# Altium footprint library Connectors THD.PcbLib: 631 footprints (part 35 of 46) (continued)
## SAMTEC_TSW-104-23-L-S [mm] "4 Contacts - Pitch 2.54mm - Single Row  Through Mount Straigh Header (Post Lead 5.84mm, Tail Lead 2.92mm, Insulator 2.54mm)"
height 8.38
pads (4):
  round 1.7 hole 1: 1(0,0) 2(2.54,0) 3(5.08,0) 4(7.62,0)
Top Overlay:
  circle w0.3: c-0.508,1.778 r0.15
  lines w0.2: 6.087,-0.762 6.087,-1.27 4.073,-1.27 4.073,-0.762 3.547,-0.762 3.547,-1.27 1.533,-1.27 1.533,-0.762 1.007,-0.762 1.007,-1.27 -1.27,-1.27 -1.27,1.27 1.007,1.27 1.007,0.762 1.533,0.762 1.533,1.27 3.547,1.27 3.547,0.762 4.073,0.762 4.073,1.27 6.087,1.27 6.087,0.762 ; 6.087,-0.762 6.613,-0.762 ; 6.087,-0.762 6.613,-0.762 ; 6.087,0.762 6.613,0.762 ; 6.087,0.762 6.613,0.762 ; 6.613,-0.762 6.613,-1.27 8.89,-1.27 8.89,1.27 6.613,1.27 6.613,0.762
Mechanical 8:
  lines w0.1: -0.5,0 0,0 ; 0,-0.5 0,0 ; 0,0.5 0,0 ; 0.5,0 0,0 ; 2.04,0 2.54,0 ; 2.54,-0.5 2.54,0 ; 2.54,0.5 2.54,0 ; 3.04,0 2.54,0 ; 4.58,0 5.08,0 ; 5.08,-0.5 5.08,0 ; 5.08,0.5 5.08,0 ; 5.58,0 5.08,0 ; 7.12,0 7.62,0 ; 7.62,-0.5 7.62,0 ; 7.62,0.5 7.62,0 ; 8.12,0 7.62,0
Mechanical 14:
  circle w0.3: c-0.508,1.778 r0.15
  lines w0.1: 1.007,-0.762 1.533,-0.762 ; 1.007,0.762 1.533,0.762 ; 3.547,-0.762 4.073,-0.762 ; 3.547,0.762 4.073,0.762 ; -1.27,-1.27 -1.27,1.27 1.007,1.27 1.007,-1.27 -1.27,-1.27 ; -0.317,-0.318 -0.318,0.317 0.317,0.317 0.318,-0.317 -0.317,-0.318 ; 1.533,-1.27 3.547,-1.27 3.547,1.27 1.533,1.27 1.533,-1.27 ; 2.223,-0.318 2.222,0.317 2.857,0.317 2.858,-0.317 2.223,-0.318 ; 4.073,-1.27 4.073,1.27 6.087,1.27 6.087,-1.27 4.073,-1.27 ; 4.763,-0.318 4.763,0.317 5.397,0.317 5.398,-0.317 4.763,-0.318 ; 6.087,-0.762 6.613,-0.762 6.087,-0.762 ; 6.087,0.762 6.613,0.762 6.087,0.762 ; 6.613,-1.27 6.613,1.27 8.89,1.27 8.89,-1.27 6.613,-1.27 ; 7.303,-0.318 7.303,0.317 7.938,0.317 7.938,-0.318 7.303,-0.318
3D body: height 8.38, standoff -2.92, extent -1.27,-1.27 8.89,1.27

## SAMTEC_TSW-105-07-L-D-LL [mm] "10 Contacts, Pitch 2.54mm - Dual Row, Through Mount Straigh Header"
height 11.05
pads (10):
  round 1.7 hole 1: 1(-5.08,-1.27) 2(-5.08,1.27) 3(-2.54,-1.27) 4(-2.54,1.27) 5(0,-1.27) 6(0,1.27) 7(2.54,-1.27) 8(2.54,1.27) 9(5.08,-1.27) 10(5.08,1.27)
Top Overlay:
  circle w0.3: c-5.045,-3.135 r0.15
  lines w0.2: -6.35,-2.54 -6.35,2.54 ; -6.35,-2.54 -6.35,2.54 ; -6.35,-2.54 -4.064,-2.54 -4.064,-2.032 -3.556,-2.032 -3.556,-2.54 -1.524,-2.54 -1.524,-2.032 -1.016,-2.032 -1.016,-2.54 1.016,-2.54 1.016,-2.032 1.524,-2.032 1.524,-2.54 3.556,-2.54 3.556,-2.032 4.064,-2.032 4.064,-2.54 6.35,-2.54 ; -6.35,2.54 -4.064,2.54 -4.064,2.032 -3.556,2.032 -3.556,2.54 -1.524,2.54 -1.524,2.032 -1.016,2.032 -1.016,2.54 1.016,2.54 1.016,2.032 1.524,2.032 1.524,2.54 3.556,2.54 3.556,2.032 4.064,2.032 4.064,2.54 6.35,2.54 ; 6.35,-2.54 6.35,2.54 ; 6.35,-2.54 6.35,2.54
  text "1" at -7.327,-1.768 h1
Mechanical 8:
  lines w0.1: -5.58,-1.27 -5.08,-1.27 ; -5.58,1.27 -5.08,1.27 ; -5.08,-1.77 -5.08,-1.27 ; -5.08,-0.77 -5.08,-1.27 ; -5.08,0.77 -5.08,1.27 ; -5.08,1.77 -5.08,1.27 ; -4.58,-1.27 -5.08,-1.27 ; -4.58,1.27 -5.08,1.27 ; -3.04,-1.27 -2.54,-1.27 ; -3.04,1.27 -2.54,1.27 ; -2.54,-1.77 -2.54,-1.27 ; -2.54,-0.77 -2.54,-1.27 ; -2.54,0.77 -2.54,1.27 ; -2.54,1.77 -2.54,1.27 ; -2.04,-1.27 -2.54,-1.27 ; -2.04,1.27 -2.54,1.27 ; -0.5,-1.27 0,-1.27 ; -0.5,0 0,0 ; -0.5,1.27 0,1.27 ; 0,-1.77 0,-1.27 ; 0,-0.77 0,-1.27 ; 0,-0.5 0,0 ; 0,0.5 0,0 ; 0,0.77 0,1.27 ; 0,1.77 0,1.27 ; 0.5,-1.27 0,-1.27 ; 0.5,0 0,0 ; 0.5,1.27 0,1.27 ; 2.04,-1.27 2.54,-1.27 ; 2.04,1.27 2.54,1.27 ; 2.54,-1.77 2.54,-1.27 ; 2.54,-0.77 2.54,-1.27 ; 2.54,0.77 2.54,1.27 ; 2.54,1.77 2.54,1.27 ; 3.04,-1.27 2.54,-1.27 ; 3.04,1.27 2.54,1.27 ; 4.58,-1.27 5.08,-1.27 ; 4.58,1.27 5.08,1.27 ; 5.08,-1.77 5.08,-1.27 ; 5.08,-0.77 5.08,-1.27 ; 5.08,0.77 5.08,1.27 ; 5.08,1.77 5.08,1.27 ; 5.58,-1.27 5.08,-1.27 ; 5.58,1.27 5.08,1.27
Mechanical 14:
  drawing of 158 lines, arcs and shapes, not listed
  text "1" at -7.327,-1.768 h1
3D body: height 8.38, standoff -2.54, extent -6.35,-2.54 6.35,2.54

## SAMTEC_TSW-132-23-L-T [mm] "96 Contacts - Pitch 2.54mm - Triple Row Through Mount Straigh Header (Lead Length 2.92mm)"
height 11.3
pads (96):
  round 1.7 hole 1: 1(-39.37,-2.54) 2(-39.37,0) 3(-39.37,2.54) 4(-36.83,-2.54) 5(-36.83,0) 6(-36.83,2.54) 7(-34.29,-2.54) 8(-34.29,0) 9(-34.29,2.54) 10(-31.75,-2.54) 11(-31.75,0) 12(-31.75,2.54) 13(-29.21,-2.54) 14(-29.21,0) 15(-29.21,2.54) 16(-26.67,-2.54) 17(-26.67,0) 18(-26.67,2.54) 19(-24.13,-2.54) 20(-24.13,0) 21(-24.13,2.54) 22(-21.59,-2.54) 23(-21.59,0) 24(-21.59,2.54) 25(-19.05,-2.54) 26(-19.05,0) 27(-19.05,2.54) 28(-16.51,-2.54) 29(-16.51,0) 30(-16.51,2.54) 31(-13.97,-2.54) 32(-13.97,0) 33(-13.97,2.54) 34(-11.43,-2.54) 35(-11.43,0) 36(-11.43,2.54) 37(-8.89,-2.54) 38(-8.89,0) 39(-8.89,2.54) 40(-6.35,-2.54) 41(-6.35,0) 42(-6.35,2.54) 43(-3.81,-2.54) 44(-3.81,0) 45(-3.81,2.54) 46(-1.27,-2.54) 47(-1.27,0) 48(-1.27,2.54) 49(1.27,-2.54) 50(1.27,0) 51(1.27,2.54) 52(3.81,-2.54) 53(3.81,0) 54(3.81,2.54) 55(6.35,-2.54) 56(6.35,0) 57(6.35,2.54) 58(8.89,-2.54) 59(8.89,0) 60(8.89,2.54) 61(11.43,-2.54) 62(11.43,0) 63(11.43,2.54) 64(13.97,-2.54) 65(13.97,0) 66(13.97,2.54) 67(16.51,-2.54) 68(16.51,0) 69(16.51,2.54) 70(19.05,-2.54) 71(19.05,0) 72(19.05,2.54) 73(21.59,-2.54) 74(21.59,0) 75(21.59,2.54) 76(24.13,-2.54) 77(24.13,0) 78(24.13,2.54) 79(26.67,-2.54) 80(26.67,0) 81(26.67,2.54) 82(29.21,-2.54) 83(29.21,0) 84(29.21,2.54) 85(31.75,-2.54) 86(31.75,0) 87(31.75,2.54) 88(34.29,-2.54) 89(34.29,0) 90(34.29,2.54) 91(36.83,-2.54) 92(36.83,0) 93(36.83,2.54) 94(39.37,-2.54) 95(39.37,0) 96(39.37,2.54)
Top Overlay:
  drawing of 253 lines, arcs and shapes, not listed
  text "3" at -41.917,2.042 h1
  text "94" at 41.34,-3.12 h1
  text "2" at -41.917,-0.498 h1
  text "1" at -41.617,-3.038 h1
  text "95" at 41.34,-0.58 h1
  text "96" at 41.34,1.96 h1
Mechanical 8:
  lines w0.1: -39.87,-2.54 -39.37,-2.54 ; -39.87,0 -39.37,0 ; -39.87,2.54 -39.37,2.54 ; -39.37,-3.04 -39.37,-2.54 ; -39.37,-2.04 -39.37,-2.54 ; -39.37,-0.5 -39.37,0 ; -39.37,0.5 -39.37,0 ; -39.37,2.04 -39.37,2.54 ; -39.37,3.04 -39.37,2.54 ; -38.87,-2.54 -39.37,-2.54 ; -38.87,0 -39.37,0 ; -38.87,2.54 -39.37,2.54 ; -0.5,0 0,0 ; 0,-0.5 0,0 ; 0,0.5 0,0 ; 0.5,0 0,0 ; 38.87,-2.54 39.37,-2.54 ; 38.87,0 39.37,0 ; 38.87,2.54 39.37,2.54 ; 39.37,-3.04 39.37,-2.54 ; 39.37,-2.04 39.37,-2.54 ; 39.37,-0.5 39.37,0 ; 39.37,0.5 39.37,0 ; 39.37,2.04 39.37,2.54 ; 39.37,3.04 39.37,2.54 ; 39.87,-2.54 39.37,-2.54 ; 39.87,0 39.37,0 ; 39.87,2.54 39.37,2.54
Mechanical 14:
  drawing of 699 lines, arcs and shapes, not listed
  text "3" at -41.917,2.042 h1
  text "94" at 41.34,-3.12 h1
  text "2" at -41.917,-0.498 h1
  text "1" at -41.617,-3.038 h1
  text "95" at 41.34,-0.58 h1
  text "96" at 41.34,1.96 h1
3D body: height 8.38, standoff -2.92, extent -40.64,-3.81 40.64,3.81

## SAMTEC_TSW-150-25-L-D-RA [mm] "100 Contacts - Pitch 2.54mm - Double Row Through Mount Right Angle Header"
height 5.56
pads (100):
  round 1.7 hole 1: 1(62.23,1.27) 2(62.23,-1.27) 3(59.69,1.27) 4(59.69,-1.27) 5(57.15,1.27) 6(57.15,-1.27) 7(54.61,1.27) 8(54.61,-1.27) 9(52.07,1.27) 10(52.07,-1.27) 11(49.53,1.27) 12(49.53,-1.27) 13(46.99,1.27) 14(46.99,-1.27) 15(44.45,1.27) 16(44.45,-1.27) 17(41.91,1.27) 18(41.91,-1.27) 19(39.37,1.27) 20(39.37,-1.27) 21(36.83,1.27) 22(36.83,-1.27) 23(34.29,1.27) 24(34.29,-1.27) 25(31.75,1.27) 26(31.75,-1.27) 27(29.21,1.27) 28(29.21,-1.27) 29(26.67,1.27) 30(26.67,-1.27) 31(24.13,1.27) 32(24.13,-1.27) 33(21.59,1.27) 34(21.59,-1.27) 35(19.05,1.27) 36(19.05,-1.27) 37(16.51,1.27) 38(16.51,-1.27) 39(13.97,1.27) 40(13.97,-1.27) 41(11.43,1.27) 42(11.43,-1.27) 43(8.89,1.27) 44(8.89,-1.27) 45(6.35,1.27) 46(6.35,-1.27) 47(3.81,1.27) 48(3.81,-1.27) 49(1.27,1.27) 50(1.27,-1.27) 51(-1.27,1.27) 52(-1.27,-1.27) 53(-3.81,1.27) 54(-3.81,-1.27) 55(-6.35,1.27) 56(-6.35,-1.27) 57(-8.89,1.27) 58(-8.89,-1.27) 59(-11.43,1.27) 60(-11.43,-1.27) 61(-13.97,1.27) 62(-13.97,-1.27) 63(-16.51,1.27) 64(-16.51,-1.27) 65(-19.05,1.27) 66(-19.05,-1.27) 67(-21.59,1.27) 68(-21.59,-1.27) 69(-24.13,1.27) 70(-24.13,-1.27) 71(-26.67,1.27) 72(-26.67,-1.27) 73(-29.21,1.27) 74(-29.21,-1.27) 75(-31.75,1.27) 76(-31.75,-1.27) 77(-34.29,1.27) 78(-34.29,-1.27) 79(-36.83,1.27) 80(-36.83,-1.27) 81(-39.37,1.27) 82(-39.37,-1.27) 83(-41.91,1.27) 84(-41.91,-1.27) 85(-44.45,1.27) 86(-44.45,-1.27) 87(-46.99,1.27) 88(-46.99,-1.27) 89(-49.53,1.27) 90(-49.53,-1.27) 91(-52.07,1.27) 92(-52.07,-1.27) 93(-54.61,1.27) 94(-54.61,-1.27) 95(-57.15,1.27) 96(-57.15,-1.27) 97(-59.69,1.27) 98(-59.69,-1.27) 99(-62.23,1.27) 100(-62.23,-1.27)
Top Overlay:
  drawing of 255 lines, arcs and shapes, not listed
  text "99" at -65.125,0.89 h1
  text "100" at -65.9,-1.735 h1
  text "50" at 0.5,-3.59 h1
  text "1" at 63.78,1.89 h1.02
  text "2" at 63.748,-1.668 h1
Mechanical 8:
  drawing of 404 lines, arcs and shapes, not listed
Mechanical 14:
  drawing of 605 lines, arcs and shapes, not listed
  text "99" at -65.125,0.89 h1
  text "100" at -65.9,-1.735 h1
  text "50" at 0.5,-3.59 h1
  text "1" at 63.78,1.89 h1.02
  text "2" at 63.748,-1.668 h1
3D body: height 5.56, standoff -2.54, extent -63.5,-1.587 63.5,13.462

## SAMTEC_USB3-B-S-F-TH [mm] "Right Angle, Shielded USB 3.0 Standard B Receptacle"
height 12.9
pads (11):
  round 1.6 hole 0.9: 1(1.25,1) 2(-1.25,1) 3(-1.25,-1) 4(1.25,-1)
  round 1.4 hole 0.7: 5(-4.25,3) 6(-2.5,3) 7(0,3) 8(2.5,3) 9(4.25,3)
  round 3 hole 2.3: SH(-6.02,-3.71) SH(6.02,-3.71)
Top Overlay:
  lines w0.2: -6,-5.61 -6,-13.415 ; -6,-1.81 -6,4.235 6,4.235 6,-1.81 ; -6,3.935 -4.829,3.935 ; -5.7,-13.415 ccw(c-5.4,-13.415) -5.4,-13.715 -3.45,-13.715 ; -5.5,3.935 -5.5,4.235 ; -5.4,-13.415 -5.4,-5.506 ; -5.4,-1.914 -5.4,3.935 ; -5.2,-13.715 -5.2,-13.415 -6,-13.415 ; -2.9,-14.015 -5.4,-14.015 cw(c-5.4,-13.415) -6,-13.415 ; -2.9,-13.953 ccw(c-2.619,-13.932) -2.6,-14.213 ; -2.9,-13.79 2.9,-13.785 ; -2.9,-13.714 -3.45,-13.715 ; -2.9,-13.635 2.9,-13.635 ; 2.6,-14.213 ccw(c2.619,-13.932) 2.9,-13.953 ; 2.9,-14.015 5.4,-14.015 ccw(c5.4,-13.415) 6,-13.415 ; 2.9,-13.714 3.45,-13.715 ; 4.829,3.935 6,3.935 ; 5.19,-13.715 5.2,-13.415 6,-13.415 ; 5.4,-13.415 5.4,-5.506 ; 5.4,-1.914 5.4,3.935 ; 5.5,3.935 5.5,4.235 ; 5.7,-13.415 cw(c5.4,-13.415) 5.4,-13.715 3.45,-13.715 ; 6,-5.61 6,-13.415 ; -3.45,-13.715 ccw(c-3.45,-13.565) -3.3,-13.565 cw(c-3.15,-13.565) -3.15,-13.415 -3.05,-13.415 cw(c-3.05,-13.565) -2.9,-13.565 -2.9,-14.103 ccw(c-2.619,-14.082) -2.6,-14.363 ; -2.6,-14.363 2.6,-14.363 ; -2.6,-14.363 -2.6,-14.213 ; -2.6,-14.213 2.6,-14.214 2.6,-14.363 ; 2.6,-14.363 ccw(c2.619,-14.082) 2.9,-14.103 2.9,-13.953 ; 2.9,-13.953 2.9,-13.565 cw(c3.05,-13.565) 3.05,-13.415 3.15,-13.415 cw(c3.15,-13.565) 3.3,-13.565 ccw(c3.45,-13.565) 3.45,-13.715
Mechanical 8:
  lines w0.1: -6.52,-3.71 -6.02,-3.71 ; -6.02,-4.21 -6.02,-3.71 ; -6.02,-3.21 -6.02,-3.71 ; -5.52,-3.71 -6.02,-3.71 ; -4.75,3 -4.25,3 ; -4.25,2.5 -4.25,3 ; -4.25,3.5 -4.25,3 ; -3.75,3 -4.25,3 ; -3,3 -2.5,3 ; -2.5,2.5 -2.5,3 ; -2.5,3.5 -2.5,3 ; -2,3 -2.5,3 ; -1.75,-1 -1.25,-1 ; -1.75,1 -1.25,1 ; -1.25,-1.5 -1.25,-1 ; -1.25,-0.5 -1.25,-1 ; -1.25,0.5 -1.25,1 ; -1.25,1.5 -1.25,1 ; -0.75,-1 -1.25,-1 ; -0.75,1 -1.25,1 ; -0.5,0 0,0 ; -0.5,3 0,3 ; 0,-0.5 0,0 ; 0,0.5 0,0 ; 0,2.5 0,3 ; 0,3.5 0,3 ; 0.5,0 0,0 ; 0.5,3 0,3 ; 0.75,-1 1.25,-1 ; 0.75,1 1.25,1 ; 1.25,-1.5 1.25,-1 ; 1.25,-0.5 1.25,-1 ; 1.25,0.5 1.25,1 ; 1.25,1.5 1.25,1 ; 1.75,-1 1.25,-1 ; 1.75,1 1.25,1 ; 2,3 2.5,3 ; 2.5,2.5 2.5,3 ; 2.5,3.5 2.5,3 ; 3,3 2.5,3 ; 3.75,3 4.25,3 ; 4.25,2.5 4.25,3 ; 4.25,3.5 4.25,3 ; 4.75,3 4.25,3 ; 5.52,-3.71 6.02,-3.71 ; 6.02,-4.21 6.02,-3.71 ; 6.02,-3.21 6.02,-3.71 ; 6.52,-3.71 6.02,-3.71
Mechanical 14:
  lines w0.1: -6,-5.015 ccw(c-6.093,-5.018) -6.026,-4.953 -7.201,-4.348 -7.252,-4.326 -7.252,-3.104 -7.201,-3.082 ; -6,-2.415 cw(c-6.093,-2.412) -6.026,-2.477 ; -6,3.935 6,3.935 ; -5.7,-13.415 ccw(c-5.4,-13.415) -5.4,-13.715 -3.45,-13.715 ; -5.5,3.935 -5.5,4.235 ; -5.4,-13.415 -5.4,3.935 ; -5.2,-13.715 -5.2,-13.415 -6,-13.415 ; -3.8,3.935 -3.8,4.235 ; -3.5,3.935 -3.5,4.235 ; -2.9,-14.015 -5.4,-14.015 cw(c-5.4,-13.415) -6,-13.415 ; -2.9,-13.953 ccw(c-2.619,-13.932) -2.6,-14.213 ; -2.9,-13.79 2.9,-13.785 ; -2.9,-13.714 -3.45,-13.715 ; -2.9,-13.635 2.9,-13.635 ; 2.6,-14.213 ccw(c2.619,-13.932) 2.9,-13.953 ; 2.9,-14.015 5.4,-14.015 ccw(c5.4,-13.415) 6,-13.415 ; 2.9,-13.714 3.45,-13.715 ; 3.5,3.935 3.5,4.235 ; 3.8,3.935 3.8,4.235 ; 5.19,-13.715 5.2,-13.415 6,-13.415 ; 5.4,-13.415 5.4,3.935 ; 5.5,3.935 5.5,4.235 ; 5.7,-13.415 cw(c5.4,-13.415) 5.4,-13.715 3.45,-13.715 ; 6,-5.015 cw(c6.093,-5.018) 6.026,-4.953 7.201,-4.348 7.252,-4.326 7.252,-3.104 7.201,-3.082 ; 6,-2.415 ccw(c6.093,-2.412) 6.026,-2.477 ; -7.201,-3.082 -6.026,-2.477 ; -7.201,-3.082 -6.026,-2.477 ; -6,-13.415 -6,4.235 6,4.235 6,-13.415 ; -3.45,-13.715 ccw(c-3.45,-13.565) -3.3,-13.565 cw(c-3.15,-13.565) -3.15,-13.415 -3.05,-13.415 cw(c-3.05,-13.565) -2.9,-13.565 -2.9,-14.103 ccw(c-2.619,-14.082) -2.6,-14.363 ; -2.6,-14.363 2.6,-14.363 ; -2.6,-14.363 -2.6,-14.213 ; -2.6,-14.213 2.6,-14.214 2.6,-14.363 ; 2.6,-14.363 ccw(c2.619,-14.082) 2.9,-14.103 2.9,-13.953 ; 2.9,-13.953 2.9,-13.565 cw(c3.05,-13.565) 3.05,-13.415 3.15,-13.415 cw(c3.15,-13.565) 3.3,-13.565 ccw(c3.45,-13.565) 3.45,-13.715 ; 6.026,-2.477 7.201,-3.082 ; 6.026,-2.477 7.201,-3.082
3D body: height 13.19, standoff -3.04, extent -7.252,-14.363 7.252,4.235

## SAMTEC_VHDCR-68-01-M-RA [mm] "68 Positions, Pitch 0.8mm, Very Hight Density Right Angle Connector, VHDCR Series"
height 6
pads (72):
  round 1.05 hole 0.65: 1(-13,-2.35) 2(-12.2,-1.2) 3(-11.4,-2.35) 4(-10.6,-1.2) 5(-9.8,-2.35) 6(-9,-1.2) 7(-8.2,-2.35) 8(-7.4,-1.2) 9(-6.6,-2.35) 10(-5.8,-1.2) 11(-5,-2.35) 12(-4.2,-1.2) 13(-3.4,-2.35) 14(-2.6,-1.2) 15(-1.8,-2.35) 16(-1,-1.2) 17(-0.2,-2.35) 18(0.6,-1.2) 19(1.4,-2.35) 20(2.2,-1.2) 21(3,-2.35) 22(3.8,-1.2) 23(4.6,-2.35) 24(5.4,-1.2) 25(6.2,-2.35) 26(7,-1.2) 27(7.8,-2.35) 28(8.6,-1.2) 29(9.4,-2.35) 30(10.2,-1.2) 31(11,-2.35) 32(11.8,-1.2) 33(12.6,-2.35) 34(13.4,-1.2) 35(-13.4,0) 36(-12.6,1.15) 37(-11.8,0) 38(-11,1.15) 39(-10.2,0) 40(-9.4,1.15) 41(-8.6,0) 42(-7.8,1.15) 43(-7,0) 44(-6.2,1.15) 45(-5.4,0) 46(-4.6,1.15) 47(-3.8,0) 48(-3,1.15) 49(-2.2,0) 50(-1.4,1.15) 51(-0.6,0) 52(0.2,1.15) 53(1,0) 54(1.8,1.15) 55(2.6,0) 56(3.4,1.15) 57(4.2,0) 58(5,1.15) 59(5.8,0) 60(6.6,1.15) 61(7.4,0) 62(8.2,1.15) 63(9,0) 64(9.8,1.15) 65(10.6,0) 66(11.4,1.15) 67(12.2,0) 68(13,1.15)
  round 2.3 hole 1.2: 69(16.17,-0.105) 70(-16.17,-0.105)
  round 1 hole 1.8 unplated: 71(20.95,2.51) 72(-20.95,2.51)
Top Layer:
  region: 17.42,-2.557 17.425,-0.76 17.544,-0.473 17.592,-0.105 17.544,0.263 17.425,0.55 17.42,0.547 17.42,2.347 19.701,2.347 19.722,2.181 19.849,1.875 20.051,1.611 20.315,1.409 20.621,1.282 20.95,1.239 21.279,1.282 21.585,1.409 21.72,1.513 21.72,-2.557
  region: -17.42,-2.557 -17.425,-0.76 -17.544,-0.473 -17.592,-0.105 -17.544,0.263 -17.425,0.55 -17.42,0.547 -17.42,2.347 -19.701,2.347 -19.722,2.181 -19.849,1.875 -20.051,1.611 -20.315,1.409 -20.621,1.282 -20.95,1.239 -21.279,1.282 -21.585,1.409 -21.72,1.513 -21.72,-2.557
Top Overlay:
  lines w0.2: -21.35,6.144 21.35,6.094 ; -21.349,3.705 -21.348,6.144 cw(c-21.048,6.144) -21.048,6.444 21.05,6.444 cw(c21.05,6.144) 21.35,6.144 21.35,3.705 ; -20.797,6.444 -20.797,7.584 -16.903,7.584 ; -20.4,7.584 -20.4,9.114 ; -17.845,11.124 -18.49,11.124 -18.49,10.124 -19.21,10.124 -19.21,11.124 -19.855,11.124 -20.765,9.714 ; -17.845,11.124 -16.938,9.714 ; -17.302,9.114 -17.3,7.584 ; -17.1,-1.314 -17.1,-3.005 -13.5,-3.005 ; -16.903,6.444 -16.9,7.584 ; -15.408,6.444 -15.408,11.144 cw(c-14.908,11.144) -14.908,11.644 15.325,11.644 cw(c15.325,11.144) 15.825,11.144 15.825,6.444 ; -14.7,-3.005 -14.7,2.435 14.7,2.435 14.7,-3.005 ; 13.5,-3.005 17.1,-3.005 17.1,-1.314 ; 16.9,7.584 16.903,6.444 ; 16.903,7.584 20.797,7.584 20.797,6.444 ; 17.3,7.584 17.302,9.114 ; 17.845,11.124 16.938,9.714 ; 17.845,11.124 18.49,11.124 18.49,10.124 19.21,10.124 19.21,11.124 19.855,11.124 20.765,9.714 ; 20.4,7.584 20.4,9.114 ; -20.765,9.714 -16.938,9.714 ; -20.765,9.714 -20.765,9.114 -16.938,9.114 -16.938,9.714 ; 16.938,9.714 20.765,9.714 ; 16.938,9.714 16.938,9.114 20.765,9.114 20.765,9.714
  text "68" at 12.411,2.611 h1
  text "33" at 11.725,-4.246 h1
  text "36" at -13.425,2.611 h1
  text "2" at -14.259,-1.706 h1
  text "1" at -13.204,-4.373 h1
Top Solder:
  region: -21.847,-2.684 -17.293,-2.684 -17.293,-0.725 -17.3,-0.729 -17.42,-0.44 -17.464,-0.105 -17.42,0.23 -17.3,0.519 -17.293,0.515 -17.293,2.474 -19.812,2.474 -19.846,2.214 -19.96,1.939 -20.142,1.702 -20.379,1.52 -20.654,1.406 -20.95,1.367 -21.246,1.406 -21.521,1.52 -21.758,1.702 -21.847,1.818
  region: 17.293,-2.684 21.847,-2.684 21.847,1.818 21.758,1.702 21.521,1.52 21.246,1.406 20.95,1.367 20.654,1.406 20.379,1.52 20.142,1.702 19.96,1.939 19.846,2.214 19.812,2.474 19.818,2.474 17.293,2.474 17.293,0.515 17.3,0.519 17.42,0.23 17.464,-0.105 17.42,-0.44 17.3,-0.729 17.293,-0.725
Mechanical 8:
  drawing of 614 lines, arcs and shapes, not listed
Mechanical 14:
  lines w0.1: -21.35,6.144 21.35,6.094 ; -20.797,6.444 -20.797,7.584 -16.903,7.584 ; -20.4,7.584 -20.4,9.114 ; -17.845,11.124 -18.49,11.124 -18.49,10.124 -19.21,10.124 -19.21,11.124 -19.855,11.124 -20.765,9.714 ; -17.845,11.124 -16.938,9.714 ; -17.302,9.114 -17.3,7.584 ; -17.1,-1.755 -19.275,-1.755 cw(c-19.275,-1.255) -19.775,-1.255 -19.775,1.045 cw(c-19.275,1.045) -19.275,1.545 -17.1,1.545 ; -17.1,-1.205 -19.075,-1.205 cw(c-19.075,-1.005) -19.275,-1.005 -19.275,0.795 cw(c-19.075,0.795) -19.075,0.995 -17.1,0.995 ; -16.903,6.444 -16.9,7.584 ; -15.408,6.444 -15.408,11.144 cw(c-14.908,11.144) -14.908,11.644 15.325,11.644 cw(c15.325,11.144) 15.825,11.144 15.825,6.444 ; -14.7,-3.005 -14.7,2.435 14.7,2.435 14.7,-3.005 17.1,-3.005 ; 16.9,7.584 16.903,6.444 ; 16.903,7.584 20.797,7.584 20.797,6.444 ; 17.1,-1.755 19.275,-1.755 ccw(c19.275,-1.255) 19.775,-1.255 19.775,1.045 ccw(c19.275,1.045) 19.275,1.545 17.1,1.545 ; 17.1,-1.205 19.075,-1.205 ccw(c19.075,-1.005) 19.275,-1.005 19.275,0.795 ccw(c19.075,0.795) 19.075,0.995 17.1,0.995 ; 17.3,7.584 17.302,9.114 ; 17.845,11.124 16.938,9.714 ; 17.845,11.124 18.49,11.124 18.49,10.124 19.21,10.124 19.21,11.124 19.855,11.124 20.765,9.714 ; 20.4,7.584 20.4,9.114 ; -20.765,9.714 -16.938,9.714 ; -20.765,9.714 -20.765,9.114 -16.938,9.114 -16.938,9.714 ; 16.938,9.714 20.765,9.714 ; 16.938,9.714 16.938,9.114 20.765,9.114 20.765,9.714 ; 17.1,-3.005 17.1,1.81 21.35,1.81 21.35,6.144 ccw(c21.05,6.144) 21.05,6.444 -21.048,6.444 ccw(c-21.048,6.144) -21.348,6.144 -21.35,1.81 -17.1,1.81 -17.1,-3.005 17.1,-3.005
  text "68" at 12.411,2.611 h1
  text "33" at 11.725,-4.246 h1
  text "36" at -13.425,2.611 h1
  text "2" at -14.259,-1.706 h1
  text "1" at -13.204,-4.373 h1
3D body: height 6, standoff -3.7, extent -21.35,-3.005 21.35,11.644

## SCHURTER_DD21.0121.1111 [mm] "IEC Appliance Inlet C14 with Line Switch 2-Pole, Fuseholder 2-Pole, for PCB Mounting"
height 32.3
pads (5):
  round 2.2 hole 1.5: 1(17.65,-9.55) 3(11.65,-9.55)
  round 2.4 hole 1.7: 2(-17.55,-9.55)
  round 5.8 hole 3.4: 4(-28,0)
  round 5.8 hole 3.4 unplated: 5(28,0)
Top Overlay:
  drawing of 222 lines, arcs and shapes, not listed
  text "L" at 17.578,-12.875 h1.5
  text "N" at 11.025,-12.95 h1.5
  text "PE" at -18.375,-17.975 h1.5
Mechanical 8:
  circle w0.1: c17.65,-9.55 r0.65
  circle w0.1: c11.65,-9.55 r0.65
  circle w0.1: c-17.55,-9.55 r0.8
  circle w0.1: c28,0 r1.8
  circle w0.1: c-28,0 r1.8
  lines w0.1: -28.5,0 -28,0 ; -28,-0.5 -28,0 ; -28,0.5 -28,0 ; -27.5,0 -28,0 ; -18.05,-9.55 -17.55,-9.55 ; -17.55,-10.05 -17.55,-9.55 ; -17.55,-9.05 -17.55,-9.55 ; -17.05,-9.55 -17.55,-9.55 ; -0.5,0 0,0 ; 0,-0.5 0,0 ; 0,0.5 0,0 ; 0.5,0 0,0 ; 1.45,0.95 1.95,0.95 ; 1.95,0.45 1.95,0.95 ; 1.95,1.45 1.95,0.95 ; 2.45,0.95 1.95,0.95 ; 11.15,-9.55 11.65,-9.55 ; 11.65,-10.05 11.65,-9.55 ; 11.65,-9.05 11.65,-9.55 ; 12.15,-9.55 11.65,-9.55 ; 17.15,-9.55 17.65,-9.55 ; 17.65,-10.05 17.65,-9.55 ; 17.65,-9.05 17.65,-9.55 ; 18.15,-9.55 17.65,-9.55 ; 27.5,0 28,0 ; 28,-0.5 28,0 ; 28,0.5 28,0 ; 28.5,0 28,0
Mechanical 14:
  drawing of 258 lines, arcs and shapes, not listed
  text "L" at 17.578,-12.875 h1.5
  text "N" at 11.025,-12.95 h1.5
  text "PE" at -18.375,-17.975 h1.5
3D body: height 32.25, standoff -4.5, extent -32.5,-25.1 32.5,13.45

## SCHURTER_GSF1.1201.31 [mm] "IEC Appliance Inlet C14 with Fuseholder 1 Pole"
height 24.45
pads (5):
  round 2.3 hole 1.6: 1(-12.7,-5.5) 2(0,-9.9) 3(9.05,-9.9)
  round 1 hole 6 unplated mask+2.5: 4(-13.5,0) 5(13.5,0)
Top Overlay:
  circle w0.2: c0,-15.7 r0.7
  lines w0.2: -16.2,-5.3 -14.3,-5.3 ccw(c-14.3,-6.5) -14.867,-7.558 cw(c-15.06,-7.92) -14.724,-8.155 ccw(c-12.35,-9.82) -15.244,-9.64 ccw(c-12.35,-9.82) -15.018,-10.957 -13.546,-10.33 cw(c-12.35,-9.82) -13.647,-9.727 -14.845,-9.662 cw(c-12.35,-9.82) -14.397,-8.385 ccw(c-15.06,-7.92) -14.678,-7.205 cw(c-14.3,-6.5) -14.3,-5.7 ; -15.483,-6.7 -16.2,-6.7 -16.2,-3.8 16.2,-3.8 16.2,-6.7 13.75,-6.7 13.75,-5.3 ; -15.075,-6.7 -13.75,-6.7 ; -14.842,-6.7 -14.769,-7.148 ; -14.447,-6.7 -14.286,-7.682 ; -14.26,-5.848 -15.052,-6.305 -14.857,-6.643 -14.124,-6.22 ; -13.75,6 -13.75,7.6 ; -13.5,-3.8 -13.5,-3.581 ; -13.5,3.581 -13.5,4.5 ; -11.65,-6.7 -10.325,-6.7 ; -11.271,-6.223 -10.543,-6.643 -10.348,-6.305 -11.151,-5.842 ; -11.114,-7.682 -10.953,-6.7 ; -11.1,-5.7 cw(c-11.1,-6.5) -10.722,-7.205 ccw(c-10.34,-7.92) -11.003,-8.385 cw(c-13.05,-9.82) -10.75,-10.8 -10.382,-10.957 ccw(c-13.05,-9.82) -10.676,-8.155 cw(c-10.34,-7.92) -10.533,-7.558 ccw(c-11.1,-6.5) -11.1,-5.3 16.2,-5.3 ; -11,-5.3 cw(c-11,-6.5) -9.8,-6.5 -9.8,-8.5 ccw(c-8.8,-8.5) -9.25,-9.393 ; -10.631,-7.148 -10.558,-6.7 ; -10.2,-7.294 -10.2,-8.5 ccw(c-8.8,-8.5) -8.8,-9.9 -5,-9.9 -5,-9.5 ; -9.8,-6.7 -9.25,-6.7 ; -9.25,-9.826 -9.25,-10.5 -8.04,-10.5 ; -9.25,-5.3 -9.25,-9.5 -4.95,-9.5 ; -8,-10.1 -8.2,-12.1 -7.52,-12.1 -7.087,-11.35 cw(c-7,-11.4) -6.913,-11.35 -6.48,-12.1 -5.8,-12.1 -6,-10.1 ; -4.95,-5.3 -4.95,-13.3 -2.4,-13.3 ; -4,-13.3 -4,-5.3 ; -4,-9.5 -1.549,-9.5 ; -3.5,-13.3 -3.5,-9.5 ; -2.25,-10.75 -2.25,-5.3 ; -2,-9.5 -2,-10.5 -2.4,-10.9 -2.4,-18 ; -1,-12.03 1,-12.03 ; -0.7,-12.43 0.7,-12.43 ; -0.4,-12.83 0.3,-12.83 ; 0,-12.03 0,-11.506 ; 1.549,-9.5 4,-9.5 ; 2,-9.5 2,-10.5 2.4,-10.9 2.4,-18 ; 2.25,-10.75 2.25,-5.3 ; 2.4,-13.3 4.95,-13.3 4.95,-5.3 ; 3.5,-13.3 3.5,-9.5 ; 4,-13.3 4,-5.3 ; 4.95,-9.5 7.518,-9.5 ; 5,-9.5 5,-10.28 7.518,-10.28 ; 5.982,-10.28 5.8,-12.1 6.48,-12.1 6.913,-11.35 cw(c7,-11.4) 7.087,-11.35 7.52,-12.1 8.2,-12.1 8.109,-11.19 ; 9.25,-8.331 9.25,-5.3 ; 9.25,-6.7 11.65,-6.7 11.65,-5.3 ; 13.5,-3.8 13.5,-3.581 ; 13.5,3.581 13.5,4.5 ; 13.75,6 13.75,7.6 ; -2.4,-18 -1.5,-18.9 1.5,-18.9 2.4,-18 ; -2.4,-18 2.4,-18 ; -17,4.5 17,4.5 17,6 -17,6 -17,4.5 ; -14.95,7.6 14.95,7.6 14.95,10 ccw(c12.95,10) 12.95,12 -12.95,12 ccw(c-12.95,10) -14.95,10 -14.95,7.6
  text "N" at 10.7,-10.65 h1.5
  text "L" at -16.822,-8.9 h1.5
Mechanical 8:
  circle w0.1: c13.5,0 r3
  circle w0.1: c-13.5,0 r3
  circle w0.1: c-12.7,-5.5 r0.8
  circle w0.1: c9.05,-9.9 r0.8
  circle w0.1: c0,-9.9 r0.8
  circle w0.1: c-12.7,-9.545 r2.5
  lines w0.1: -14,0 -13.5,0 ; -13.5,-0.5 -13.5,0 ; -13.5,0.5 -13.5,0 ; -13.407,-10.252 -12.7,-9.545 ; -13.407,-8.838 -12.7,-9.545 ; -13.2,-5.5 -12.7,-5.5 ; -13,0 -13.5,0 ; -12.7,-6 -12.7,-5.5 ; -12.7,-5 -12.7,-5.5 ; -12.2,-5.5 -12.7,-5.5 ; -11.993,-10.252 -12.7,-9.545 ; -11.993,-8.838 -12.7,-9.545 ; -8.875,-4.425 -12.7,-8.25 -12.7,-9.545 ; -0.5,-9.9 0,-9.9 ; -0.5,0 0,0 ; 0,-10.4 0,-9.9 ; 0,-9.4 0,-9.9 ; 0,-0.5 0,0 ; 0,0.5 0,0 ; 0.5,-9.9 0,-9.9 ; 0.5,0 0,0 ; 8.55,-9.9 9.05,-9.9 ; 9.05,-10.4 9.05,-9.9 ; 9.05,-9.4 9.05,-9.9 ; 9.55,-9.9 9.05,-9.9 ; 13,0 13.5,0 ; 13.5,-0.5 13.5,0 ; 13.5,0.5 13.5,0 ; 14,0 13.5,0
  text "Must be 2mm" at -5.075,-5.95 h1
  text "3D Fuse (5X20) Stand-off Heigh" at -11.525,-3.975 h1
Mechanical 14:
  circle w0.1: c0,-15.7 r0.7
  lines w0.1: -16.2,-5.3 16.2,-5.3 ; -16.175,-1.243 -16.985,-1.243 cw(c-13.5,0) -16.985,1.243 -16.175,1.243 ; -15.483,-6.7 -16.2,-6.7 -16.2,-3.8 16.2,-3.8 16.2,-6.7 13.75,-6.7 13.75,-5.3 ; -15.075,-6.7 -13.75,-6.7 -13.75,-6.004 ; -14.842,-6.7 -14.769,-7.148 ; -14.447,-6.7 -14.286,-7.682 ; -14.3,-5.3 ccw(c-14.3,-6.5) -14.867,-7.558 cw(c-15.06,-7.92) -14.724,-8.155 ccw(c-12.35,-9.82) -15.244,-9.64 ccw(c-12.35,-9.82) -15.018,-10.957 -13.546,-10.33 cw(c-12.35,-9.82) -13.647,-9.727 -14.845,-9.662 cw(c-12.35,-9.82) -14.397,-8.385 ccw(c-15.06,-7.92) -14.678,-7.205 cw(c-14.3,-6.5) -14.3,-5.7 -11.1,-5.7 cw(c-11.1,-6.5) -10.722,-7.205 ccw(c-10.34,-7.92) -11.003,-8.385 cw(c-13.05,-9.82) -10.75,-10.8 -10.382,-10.957 ccw(c-13.05,-9.82) -10.676,-8.155 cw(c-10.34,-7.92) -10.533,-7.558 ccw(c-11.1,-6.5) -11.1,-5.3 ; -14.003,-5.7 -15.052,-6.305 -14.857,-6.643 -13.278,-5.732 cw(c-13.123,-6) -13.201,-5.7 ; -13.75,6 -13.75,7.6 ; -13.5,-3.8 -13.5,4.5 ; -13.5,-2.95 cw(c-13.5,0) -13.5,2.95 ; -12.199,-5.7 cw(c-12.277,-6) -12.122,-5.732 -10.543,-6.643 -10.348,-6.305 -11.397,-5.7 ; -11.65,-6.004 -11.65,-6.7 -10.325,-6.7 ; -11.114,-7.682 -10.953,-6.7 ; -11,-5.3 cw(c-11,-6.5) -9.8,-6.5 -9.8,-8.5 ccw(c-8.8,-8.5) -9.25,-9.393 ; -10.631,-7.148 -10.558,-6.7 ; -10.2,-7.294 -10.2,-8.5 ccw(c-8.8,-8.5) -8.8,-9.9 -5,-9.9 -5,-9.5 ; -9.8,-6.7 -9.25,-6.7 ; -9.25,-9.826 -9.25,-10.5 -8.04,-10.5 ; -9.25,-5.3 -9.25,-9.5 -4.95,-9.5 ; -8,-10.1 -8.2,-12.1 -7.52,-12.1 -7.087,-11.35 cw(c-7,-11.4) -6.913,-11.35 -6.48,-12.1 -5.8,-12.1 -6,-10.1 ; -4.95,-5.3 -4.95,-13.3 -2.4,-13.3 ; -4,-13.3 -4,-5.3 ; -4,-9.5 4,-9.5 ; -3.5,-13.3 -3.5,-9.5 ; -2.25,-10.75 -2.25,-5.3 ; -2,-9.5 -2,-10.5 -2.4,-10.9 -2.4,-18 ; -1,-12.03 1,-12.03 ; -0.7,-12.43 0.7,-12.43 ; -0.4,-12.83 0.3,-12.83 ; 0,-12.03 0,-11.43 ; 2,-9.5 2,-10.5 2.4,-10.9 2.4,-18 ; 2.25,-10.75 2.25,-5.3 ; 2.4,-13.3 4.95,-13.3 4.95,-5.3 ; 3.5,-13.3 3.5,-9.5 ; 4,-13.3 4,-5.3 ; 4.95,-9.5 9,-9.5 9,-10.28 5,-10.28 5,-9.5 ; 5.982,-10.28 5.8,-12.1 6.48,-12.1 6.913,-11.35 cw(c7,-11.4) 7.087,-11.35 7.52,-12.1 8.2,-12.1 8.018,-10.28 ; 8.04,-10.5 9.25,-10.5 9.25,-5.3 ; 9.25,-10.28 9.7,-10.28 9.7,-9.5 9.25,-9.5 ; 9.25,-6.7 11.65,-6.7 11.65,-5.3 ; 13.5,-3.8 13.5,4.5 ; 13.5,-2.95 ccw(c13.5,0) 13.5,2.95 ; 13.75,6 13.75,7.6 ; 16.175,-1.243 16.985,-1.243 ccw(c13.5,0) 16.985,1.243 16.175,1.243 ; -2.4,-18 -1.5,-18.9 1.5,-18.9 2.4,-18 ; -2.4,-18 2.4,-18 ; -17,4.5 17,4.5 17,6 -17,6 -17,4.5 ; -14.95,7.6 14.95,7.6 14.95,10 ccw(c12.95,10) 12.95,12 -12.95,12 ccw(c-12.95,10) -14.95,10 -14.95,7.6
  text "N" at 10.7,-10.65 h1.5
  text "L" at -16.822,-8.9 h1.5
3D body: height 24.45, standoff -4.55, extent -17.176,-18.9 17.176,12

## SCHURTER_GSF1.2202.31 [mm] "IEC Appliance Inlet C14 with 2 Pole Fuseholder"
height 24.45
pads (5):
  round 2.1 hole 1.4: 1(-12.7,-5.5) 3(12.7,-5.5)
  round 2.3 hole 1.6: 2(0,-9.9)
  round 1 hole 6 unplated mask+2.5: 4(-13.5,0) 5(13.5,0)
Top Overlay:
  drawing of 178 lines, arcs and shapes, not listed
  text "L" at -16.797,-8.925 h1.5
  text "N" at 15.9,-8.95 h1.5
Mechanical 8:
  circle w0.1: c-12.7,-9.545 r2.5
  circle w0.1: c12.7,-9.545 r2.5
  lines w0.1: -14.5,0 -13.5,0 ; -13.7,-5.5 -12.7,-5.5 ; -13.5,-1 -13.5,0 ; -13.5,1 -13.5,0 ; -13.407,-10.252 -12.7,-9.545 ; -13.407,-8.838 -12.7,-9.545 ; -12.7,-6.5 -12.7,-5.5 ; -12.7,-4.5 -12.7,-5.5 ; -12.5,0 -13.5,0 ; -11.993,-10.252 -12.7,-9.545 ; -11.993,-8.838 -12.7,-9.545 ; -11.7,-5.5 -12.7,-5.5 ; -8.875,-4.425 -12.7,-8.25 -12.7,-9.545 ; -1,-9.9 0,-9.9 ; -1,0 0,0 ; 0,-10.9 0,-9.9 ; 0,-8.9 0,-9.9 ; 0,-1 0,0 ; 0,1 0,0 ; 1,-9.9 0,-9.9 ; 1,0 0,0 ; 8.875,-4.425 12.7,-8.25 12.7,-9.545 ; 11.7,-5.5 12.7,-5.5 ; 11.993,-10.252 12.7,-9.545 ; 11.993,-8.838 12.7,-9.545 ; 12.5,0 13.5,0 ; 12.7,-6.5 12.7,-5.5 ; 12.7,-4.5 12.7,-5.5 ; 13.407,-10.252 12.7,-9.545 ; 13.407,-8.838 12.7,-9.545 ; 13.5,-1 13.5,0 ; 13.5,1 13.5,0 ; 13.7,-5.5 12.7,-5.5 ; 14.5,0 13.5,0
  text "Must be 2mm" at -5.075,-5.95 h1
  text "3D Fuse (5X20) Stand-off Heigh" at -11.525,-3.975 h1
Mechanical 14:
  drawing of 175 lines, arcs and shapes, not listed
  text "L" at -16.797,-8.925 h1.5
  text "N" at 15.9,-8.95 h1.5
3D body: height 24.45, standoff -4.55, extent -17.176,-13.3 17.176,12